# Altium footprint library ICs And Semiconductors SMD.PcbLib: 602 footprints (part 7 of 38)
Each footprint in its own frame and in the unit in brackets; x right, y up, seen from the top. Pads: shape width x height; smd on the part's side, far side on the other; paste and mask are expansions set on the pad; w line width, h text height; cw(c..) or ccw(c..) is an arc to the next point about the centre after c.
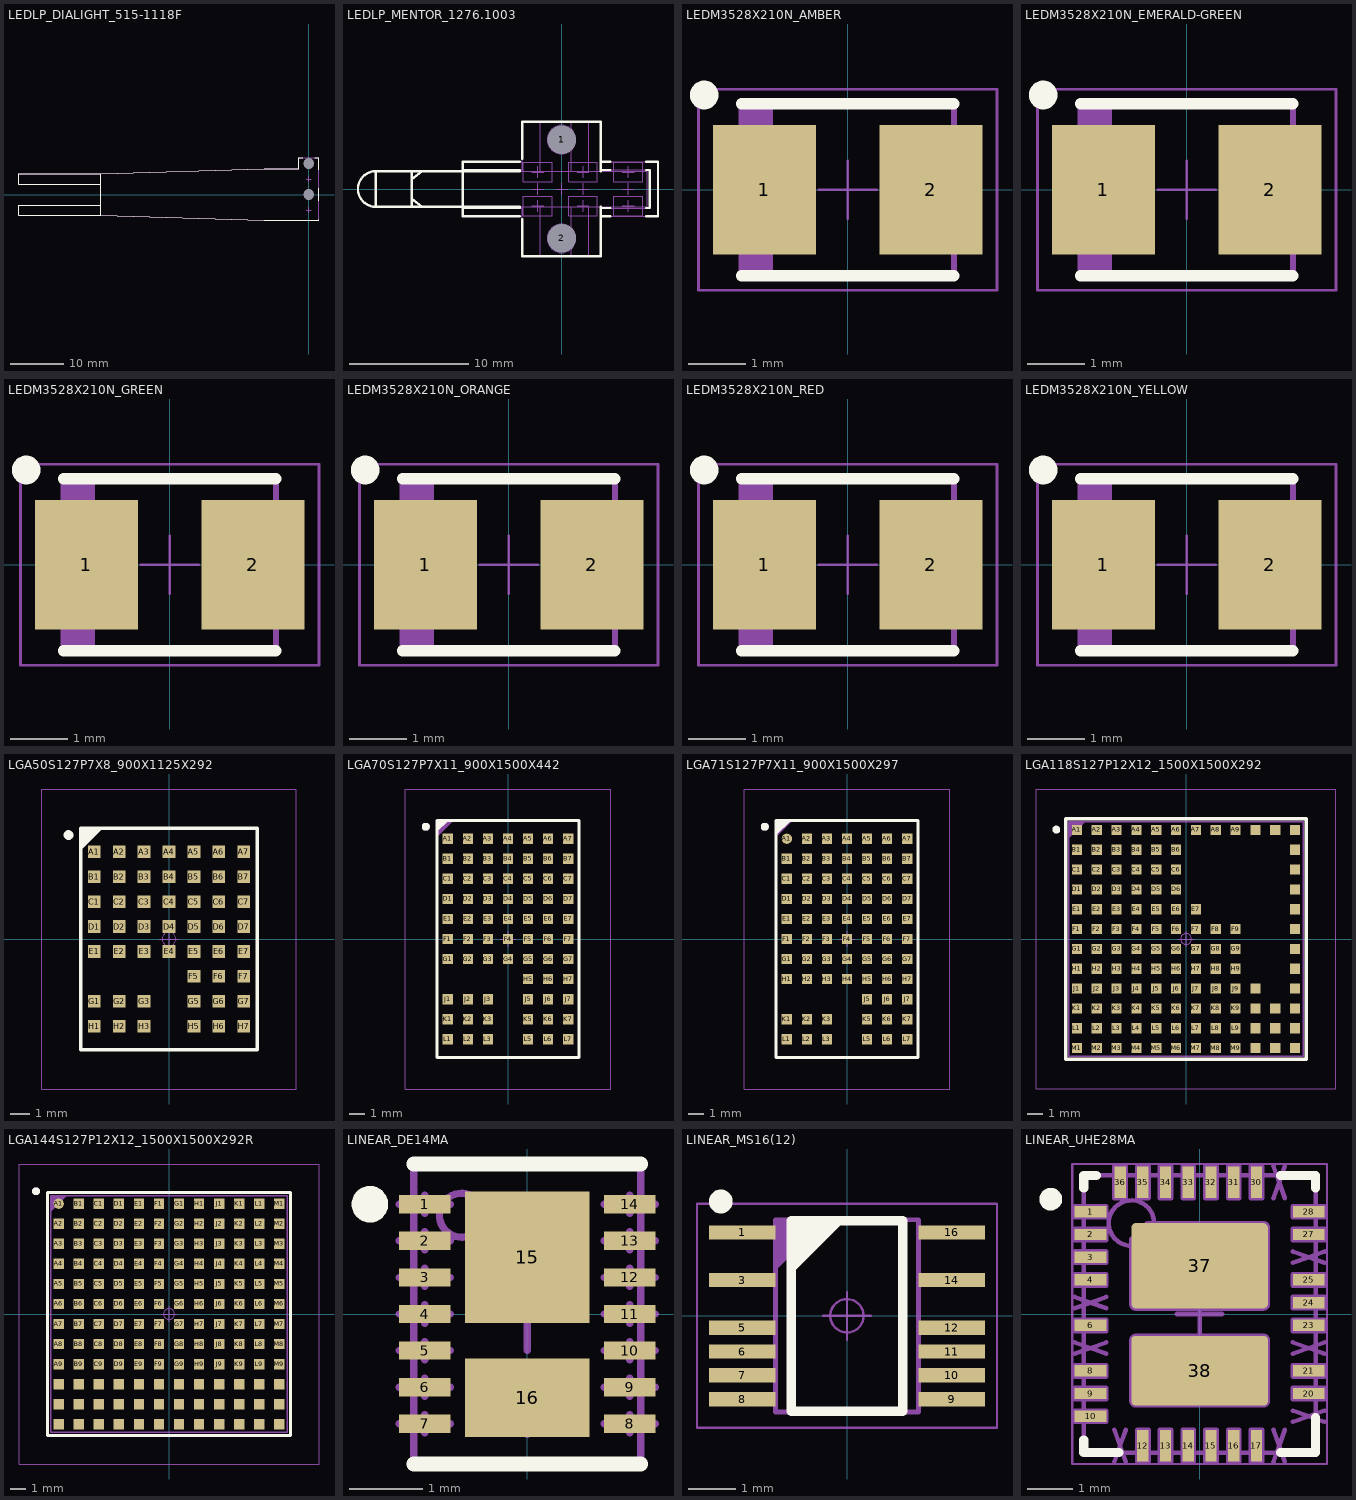
[diagram p6: the footprints below, top view; thin cyan lines are the x and y axes]

## LEDLP_DIALIGHT_515-1118F [mm] "2 Array 1.9mm Round Horizontal Light Pipe, Body 55.8 x11.68mm"
height 14
pads (2):
  round 1 hole 2 unplated mask+0.5: 1(0,0) 2(0,5.791)
Top Overlay:
  lines w0.2: -38.735,-1.943 -53.975,-1.943 -53.975,-3.848 -38.735,-3.848 ; -38.735,1.943 -53.975,1.943 -53.975,3.848 -38.735,3.848 ; -1.1,6.883 -1.905,6.883 -1.905,4.801 -8.255,4.801 -38.735,3.848 ; 1.1,6.883 1.905,6.883 1.905,4.642 ; 1.905,-4.642 1.905,-4.801 -8.255,-4.801 -38.735,-3.848 ; 1.905,-1.149 1.905,1.149 ; -38.735,-3.848 -38.735,3.848
Mechanical 8:
  lines w0.1: -0.5,-2.896 0,-2.896 ; -0.5,0 0,0 ; -0.5,2.896 0,2.896 ; -0.5,5.791 0,5.791 ; 0,-3.396 0,-2.896 ; 0,-2.396 0,-2.896 ; 0,-0.5 0,0 ; 0,0.5 0,0 ; 0,2.396 0,2.896 ; 0,3.396 0,2.896 ; 0,5.291 0,5.791 ; 0,6.291 0,5.791 ; 0.5,-2.896 0,-2.896 ; 0.5,0 0,0 ; 0.5,2.896 0,2.896 ; 0.5,5.791 0,5.791
Mechanical 14:
  lines w0.1: -38.735,-1.943 -53.975,-1.943 -53.975,-3.848 -38.735,-3.848 ; -38.735,1.943 -53.975,1.943 -53.975,3.848 -38.735,3.848 ; -38.735,-3.848 -38.735,3.848 ; -38.735,-3.848 -8.255,-4.801 1.905,-4.801 1.905,6.883 -1.905,6.883 -1.905,4.801 -8.255,4.801 -38.735,3.848
3D body "LEDLP_DIALIGHT_515-1118F.stp": height 13.98, standoff -3.17, extent -53.975,-4.8 1.905,6.884

## LEDLP_MENTOR_1276.1003 [mm] "Right Angle Tri-Level 3mm Round Light Pipe, Body 25.2 x 11.3mm"
height 18.2
pads (2):
  round 1 hole 2.4 unplated mask+0.8: 1(0,4.15) 2(0,-4.15)
Top Overlay:
  lines w0.2: -12.6,-1.5 -12.6,1.5 ; -12.6,-0.794 -11.7,-1.5 ; -12.6,0.794 -11.7,1.5 ; -8.3,-1.6 -3.5,-1.6 ; -8.3,1.6 -3.5,1.6 ; -3.5,-2.3 -8.3,-2.3 -8.3,2.3 -3.5,2.3 ; -3.5,-1.5 -15.6,-1.5 ; -3.5,1.5 -15.6,1.5 ; -3.3,-2.55 -3.3,-5.65 3.3,-5.65 3.3,-2.3 ; -3.3,2.55 -3.3,5.65 3.3,5.65 3.3,2.3 ; 3.3,-1.5 3.3,-2.3 ; 3.3,1.5 3.3,2.3 ; 3.3,1.6 4.1,1.6 ; 3.317,-1.6 4.1,-1.6 ; 4.1,-2.3 3.3,-2.3 ; 4.1,2.3 3.3,2.3 ; 7.1,-2.3 8.1,-2.3 8.1,2.3 7.1,2.3 ; 7.1,-1.6 7.4,-1.6 7.4,1.6 7.1,1.6 ; -15.6,-1.5 cw(c-15.6,0) -15.6,1.5 ; -15.6,-1.5 -15.6,1.5
Mechanical 8:
  circle w0.1: c0,-4.15 r1.2
  circle w0.1: c0,4.15 r1.2
  lines w0.1: -2.5,-1.425 -2,-1.425 ; -2.5,0 -2,0 ; -2.5,1.425 -2,1.425 ; -2,-1.925 -2,-1.425 ; -2,-0.925 -2,-1.425 ; -2,-0.5 -2,0 ; -2,0.5 -2,0 ; -2,0.925 -2,1.425 ; -2,1.925 -2,1.425 ; -1.5,-1.425 -2,-1.425 ; -1.5,0 -2,0 ; -1.5,1.425 -2,1.425 ; -0.5,-4.15 0,-4.15 ; -0.5,0 0,0 ; -0.5,4.15 0,4.15 ; 0,-4.65 0,-4.15 ; 0,-3.65 0,-4.15 ; 0,-0.5 0,0 ; 0,0.5 0,0 ; 0,3.65 0,4.15 ; 0,4.65 0,4.15 ; 0.5,-4.15 0,-4.15 ; 0.5,0 0,0 ; 0.5,4.15 0,4.15 ; 1.3,-1.425 1.8,-1.425 ; 1.3,0 1.8,0 ; 1.3,1.425 1.8,1.425 ; 1.8,-1.925 1.8,-1.425 ; 1.8,-0.925 1.8,-1.425 ; 1.8,-0.5 1.8,0 ; 1.8,0.5 1.8,0 ; 1.8,0.925 1.8,1.425 ; 1.8,1.925 1.8,1.425 ; 2.3,-1.425 1.8,-1.425 ; 2.3,0 1.8,0 ; 2.3,1.425 1.8,1.425 ; 5.1,-1.425 5.6,-1.425 ; 5.1,0 5.6,0 ; 5.1,1.425 5.6,1.425 ; 5.6,-1.925 5.6,-1.425 ; 5.6,-0.925 5.6,-1.425 ; 5.6,-0.5 5.6,0 ; 5.6,0.5 5.6,0 ; 5.6,0.925 5.6,1.425 ; 5.6,1.925 5.6,1.425 ; 6.1,-1.425 5.6,-1.425 ; 6.1,0 5.6,0 ; 6.1,1.425 5.6,1.425 ; -3.2,-2.25 -0.8,-2.25 -0.8,-0.6 -3.2,-0.6 -3.2,-2.25 ; -3.2,0.6 -0.8,0.6 -0.8,2.25 -3.2,2.25 -3.2,0.6 ; 0.6,-2.25 3,-2.25 3,-0.6 0.6,-0.6 0.6,-2.25 ; 0.6,0.6 3,0.6 3,2.25 0.6,2.25 0.6,0.6 ; 4.4,-2.25 6.8,-2.25 6.8,-0.6 4.4,-0.6 4.4,-2.25 ; 4.4,0.6 6.8,0.6 6.8,2.25 4.4,2.25 4.4,0.6
Mechanical 14:
  lines w0.1: -12.6,-1.5 -12.6,1.5 ; -12.6,-0.794 -11.7,-1.5 ; -12.6,0.794 -11.7,1.5 ; -8.3,-1.6 -3.3,-1.6 ; -8.3,1.6 -3.3,1.6 ; -3.3,-1.5 -3.3,-2.3 ; -3.3,1.5 -3.3,5.65 3.3,5.65 3.3,2.3 ; -3.3,2.3 -8.3,2.3 -8.3,-2.3 -3.3,-2.3 ; -1.8,-5.65 -1.8,-1.5 ; -1.8,1.5 -1.8,5.65 ; 0.8,-5.65 0.8,-1.5 ; 0.8,1.5 0.8,5.65 ; 2.3,-5.65 2.3,-1.5 ; 2.3,1.5 2.3,5.65 ; 3.3,-1.5 3.3,-2.3 ; 3.3,1.5 3.3,2.3 ; 3.3,1.6 7.4,1.6 7.4,-1.6 3.317,-1.6 ; -15.6,-1.5 cw(c-15.6,0) -15.6,1.5 ; -15.6,-1.5 -15.6,1.5 ; -15.6,-1.5 7.193,-1.5 7.193,1.5 -15.6,1.5 ; -3.3,-2.3 -3.3,-5.65 3.3,-5.65 3.3,-2.3 ; 3.3,-2.3 8.1,-2.3 8.1,2.3 3.3,2.3
3D body "LEDLP_MENTOR_1276.1003.stp": height 18.2, standoff -2.9, extent -17.1,-5.65 8.1,5.65

## LEDM3528X210N_AMBER [mm] "Molded SMD AMBER LED, 2-Leads, Body 3.5x2.8mm, IPC Medium Density"
height 2.1
pads (2):
  rect 1.8x2.25 smd: 1(-1.45,0) 2(1.45,0)
Top Overlay:
  circle w0.25: c-2.5,1.65 r0.125
  lines w0.2: -1.85,-1.5 1.85,-1.5 ; -1.85,1.5 1.85,1.5
Mechanical 14:
  lines w0.1: -1.8,-1.5 -1.8,1.5 ; -1.725,-1.5 -1.725,1.5 ; -1.65,-1.5 -1.65,1.5 ; -1.575,-1.5 -1.575,1.5 ; -1.5,-1.5 -1.5,1.5 ; -1.425,-1.5 -1.425,1.5 ; -1.35,-1.5 -1.35,1.5 ; -1.85,-1.5 1.85,-1.5 1.85,1.5 -1.85,1.5 -1.85,-1.5
Mechanical 15:
  lines w0.05: -0.5,0 0.5,0 ; 0,-0.5 0,0.5 ; -2.6,-1.75 2.6,-1.75 2.6,1.75 -2.6,1.75 -2.6,-1.75
3D body "LEDM3528X210N_AMBER.stp": height 2.1, standoff 0, extent -1.85,-1.5 1.85,1.5

## LEDM3528X210N_EMERALD-GREEN [mm] "Molded SMD Emerald Green LED, 2-Leads, Body 3.5x2.8mm, IPC Medium Density"
height 2.1
pads (2):
  rect 1.8x2.25 smd: 1(-1.45,0) 2(1.45,0)
Top Overlay:
  circle w0.25: c-2.5,1.65 r0.125
  lines w0.2: -1.85,-1.5 1.85,-1.5 ; -1.85,1.5 1.85,1.5
Mechanical 14:
  lines w0.1: -1.8,-1.5 -1.8,1.5 ; -1.725,-1.5 -1.725,1.5 ; -1.65,-1.5 -1.65,1.5 ; -1.575,-1.5 -1.575,1.5 ; -1.5,-1.5 -1.5,1.5 ; -1.425,-1.5 -1.425,1.5 ; -1.35,-1.5 -1.35,1.5 ; -1.85,-1.5 -1.85,1.5 1.85,1.5 1.85,-1.5 -1.85,-1.5
Mechanical 15:
  lines w0.05: -0.5,0 0.5,0 ; 0,-0.5 0,0.5 ; -2.6,-1.75 -2.6,1.75 2.6,1.75 2.6,-1.75 -2.6,-1.75
3D body "LEDM3528X210N_EMERALD-GREEN.stp": height 2.1, standoff 0, extent -1.85,-1.5 1.85,1.5

## LEDM3528X210N_GREEN [mm] "Molded SMD Green LED, 2-Leads, Body 3.5x2.8mm, IPC Medium Density"
height 2.1
pads (2):
  rect 1.8x2.25 smd: 1(-1.45,0) 2(1.45,0)
Top Overlay:
  circle w0.25: c-2.5,1.65 r0.125
  lines w0.2: -1.85,-1.5 1.85,-1.5 ; -1.85,1.5 1.85,1.5
Mechanical 14:
  lines w0.1: -1.8,-1.5 -1.8,1.5 ; -1.725,-1.5 -1.725,1.5 ; -1.65,-1.5 -1.65,1.5 ; -1.575,-1.5 -1.575,1.5 ; -1.5,-1.5 -1.5,1.5 ; -1.425,-1.5 -1.425,1.5 ; -1.35,-1.5 -1.35,1.5 ; -1.85,-1.5 -1.85,1.5 1.85,1.5 1.85,-1.5 -1.85,-1.5
Mechanical 15:
  lines w0.05: -0.5,0 0.5,0 ; 0,-0.5 0,0.5 ; -2.6,-1.75 -2.6,1.75 2.6,1.75 2.6,-1.75 -2.6,-1.75
3D body "LEDM3528X210N_GREEN.stp": height 2.1, standoff 0, extent -1.85,-1.5 1.85,1.5

## LEDM3528X210N_ORANGE [mm] "Molded SMD ORANGE LED, 2-Leads, Body 3.5x2.8mm, IPC Medium Density"
height 2.1
pads (2):
  rect 1.8x2.25 smd: 1(-1.45,0) 2(1.45,0)
Top Overlay:
  circle w0.25: c-2.5,1.65 r0.125
  lines w0.2: -1.85,-1.5 1.85,-1.5 ; -1.85,1.5 1.85,1.5
Mechanical 14:
  lines w0.1: -1.8,-1.5 -1.8,1.5 ; -1.725,-1.5 -1.725,1.5 ; -1.65,-1.5 -1.65,1.5 ; -1.575,-1.5 -1.575,1.5 ; -1.5,-1.5 -1.5,1.5 ; -1.425,-1.5 -1.425,1.5 ; -1.35,-1.5 -1.35,1.5 ; -1.85,-1.5 1.85,-1.5 1.85,1.5 -1.85,1.5 -1.85,-1.5
Mechanical 15:
  lines w0.05: -0.5,0 0.5,0 ; 0,-0.5 0,0.5 ; -2.6,-1.75 2.6,-1.75 2.6,1.75 -2.6,1.75 -2.6,-1.75
3D body "LEDM3528X210N_ORANGE.stp": height 2.1, standoff 0, extent -1.85,-1.5 1.85,1.5

## LEDM3528X210N_RED [mm] "Molded SMD RED LED, 2-Leads, Body 3.5x2.8mm, IPC Medium Density"
height 2.1
pads (2):
  rect 1.8x2.25 smd: 1(-1.45,0) 2(1.45,0)
Top Overlay:
  circle w0.25: c-2.5,1.65 r0.125
  lines w0.2: -1.85,-1.5 1.85,-1.5 ; -1.85,1.5 1.85,1.5
Mechanical 14:
  lines w0.1: -1.8,-1.5 -1.8,1.5 ; -1.725,-1.5 -1.725,1.5 ; -1.65,-1.5 -1.65,1.5 ; -1.575,-1.5 -1.575,1.5 ; -1.5,-1.5 -1.5,1.5 ; -1.425,-1.5 -1.425,1.5 ; -1.35,-1.5 -1.35,1.5 ; -1.85,-1.5 -1.85,1.5 1.85,1.5 1.85,-1.5 -1.85,-1.5
Mechanical 15:
  lines w0.05: -0.5,0 0.5,0 ; 0,-0.5 0,0.5 ; -2.6,-1.75 -2.6,1.75 2.6,1.75 2.6,-1.75 -2.6,-1.75
3D body "LEDM3528X210N_RED.stp": height 2.1, standoff 0, extent -1.85,-1.5 1.85,1.5

## LEDM3528X210N_YELLOW [mm] "Molded SMD YELLOW LED, 2-Leads, Body 3.5x2.8mm, IPC Medium Density"
height 2.1
pads (2):
  rect 1.8x2.25 smd: 1(-1.45,0) 2(1.45,0)
Top Overlay:
  circle w0.25: c-2.5,1.65 r0.125
  lines w0.2: -1.85,-1.5 1.85,-1.5 ; -1.85,1.5 1.85,1.5
Mechanical 14:
  lines w0.1: -1.8,-1.5 -1.8,1.5 ; -1.725,-1.5 -1.725,1.5 ; -1.65,-1.5 -1.65,1.5 ; -1.575,-1.5 -1.575,1.5 ; -1.5,-1.5 -1.5,1.5 ; -1.425,-1.5 -1.425,1.5 ; -1.35,-1.5 -1.35,1.5 ; -1.85,-1.5 1.85,-1.5 1.85,1.5 -1.85,1.5 -1.85,-1.5
Mechanical 15:
  lines w0.05: -0.5,0 0.5,0 ; 0,-0.5 0,0.5 ; -2.6,-1.75 2.6,-1.75 2.6,1.75 -2.6,1.75 -2.6,-1.75
3D body "LEDM3528X210N_YELLOW.stp": height 2.1, standoff 0, extent -1.85,-1.5 1.85,1.5

## LGA50S127P7X8_900X1125X292 [mm] "LGA, 1.27mm pitch,rect.; 50 pin,7 columns X 8 rows, 9.00mm X 11.25mm X 2.92mm H"
height 2.92
pads (50):
  rect 0.65x0.65 smd: A1(-3.81,4.445) A2(-2.54,4.445) A3(-1.27,4.445) A4(0,4.445) A5(1.27,4.445) A6(2.54,4.445) A7(3.81,4.445) B1(-3.81,3.175) B2(-2.54,3.175) B3(-1.27,3.175) B4(0,3.175) B5(1.27,3.175) B6(2.54,3.175) B7(3.81,3.175) C1(-3.81,1.905) C2(-2.54,1.905) C3(-1.27,1.905) C4(0,1.905) C5(1.27,1.905) C6(2.54,1.905) C7(3.81,1.905) D1(-3.81,0.635) D2(-2.54,0.635) D3(-1.27,0.635) D4(0,0.635) D5(1.27,0.635) D6(2.54,0.635) D7(3.81,0.635) E1(-3.81,-0.635) E2(-2.54,-0.635) E3(-1.27,-0.635) E4(0,-0.635) E5(1.27,-0.635) E6(2.54,-0.635) E7(3.81,-0.635) F5(1.27,-1.905) F6(2.54,-1.905) F7(3.81,-1.905) G1(-3.81,-3.175) G2(-2.54,-3.175) G3(-1.27,-3.175) G5(1.27,-3.175) G6(2.54,-3.175) G7(3.81,-3.175) H1(-3.81,-4.445) H2(-2.54,-4.445) H3(-1.27,-4.445) H5(1.27,-4.445) H6(2.54,-4.445) H7(3.81,-4.445)
Top Overlay:
  circle w0.25: c-5.125,5.3 r0.125
  lines w0.2: -4.5,4.65 -3.5,5.65 ; -4.5,4.85 -3.7,5.65 ; -4.5,5.05 -3.9,5.65 ; -4.5,5.25 -4.1,5.65 ; -4.5,5.45 -4.3,5.65 ; -4.5,-5.65 -4.5,5.65 4.5,5.65 4.5,-5.65 -4.5,-5.65
Mechanical 14:
  lines w0.1: -4.5,4.65 -3.5,5.65 ; -4.5,4.75 -3.6,5.65 ; -4.5,4.85 -3.7,5.65 ; -4.5,4.95 -3.8,5.65 ; -4.5,5.05 -3.9,5.65 ; -4.5,5.15 -4,5.65 ; -4.5,5.25 -4.1,5.65 ; -4.5,5.35 -4.2,5.65 ; -4.5,5.45 -4.3,5.65 ; -4.5,5.55 -4.4,5.65 ; -4.5,-5.625 -4.5,5.625 4.5,5.625 4.5,-5.625 -4.5,-5.625
  text "6" at 2.477,5.988 h0.4
  text "5" at 1.207,5.988 h0.4
  text "4" at -0.063,5.988 h0.4
  text "7" at 3.747,5.988 h0.4
  text "3" at -1.333,5.988 h0.4
  text "2" at -2.603,5.988 h0.4
  text "1" at -3.873,5.988 h0.4
  text "A" at -5.016,4.337 h0.4
  text "B" at -5.016,3.067 h0.4
  text "C" at -5.016,1.797 h0.4
  text "D" at -5.016,0.527 h0.4
  text "E" at -5.016,-0.743 h0.4
  text "F" at -5.016,-2.013 h0.4
  text "G" at -5.016,-3.283 h0.4
  text "H" at -5.016,-4.553 h0.4
Mechanical 15:
  circle w0.05: c0,0 r0.35
  lines w0.05: -0.5,0 0.5,0 ; 0,-0.5 0,0.5 ; -6.5,-7.65 -6.5,7.65 6.5,7.65 6.5,-7.65 -6.5,-7.65
3D body "LGA50S127P7X8_900X1125X292.stp": height 2.92, standoff 0, extent -4.5,-5.625 4.5,5.625

## LGA70S127P7X11_900X1500X442 [mm] "LGA, 1.27mm pitch, rect., 70 pin, 7 columns X 11 rows, 9mm X 15mm X 4.42mm H"
height 4.42
pads (70):
  rect 0.65x0.65 smd: A1(-3.81,6.35) A2(-2.54,6.35) A3(-1.27,6.35) A4(0,6.35) A5(1.27,6.35) A6(2.54,6.35) A7(3.81,6.35) B1(-3.81,5.08) B2(-2.54,5.08) B3(-1.27,5.08) B4(0,5.08) B5(1.27,5.08) B6(2.54,5.08) B7(3.81,5.08) C1(-3.81,3.81) C2(-2.54,3.81) C3(-1.27,3.81) C4(0,3.81) C5(1.27,3.81) C6(2.54,3.81) C7(3.81,3.81) D1(-3.81,2.54) D2(-2.54,2.54) D3(-1.27,2.54) D4(0,2.54) D5(1.27,2.54) D6(2.54,2.54) D7(3.81,2.54) E1(-3.81,1.27) E2(-2.54,1.27) E3(-1.27,1.27) E4(0,1.27) E5(1.27,1.27) E6(2.54,1.27) E7(3.81,1.27) F1(-3.81,0) F2(-2.54,0) F3(-1.27,0) F4(0,0) F5(1.27,0) F6(2.54,0) F7(3.81,0) G1(-3.81,-1.27) G2(-2.54,-1.27) G3(-1.27,-1.27) G4(0,-1.27) G5(1.27,-1.27) G6(2.54,-1.27) G7(3.81,-1.27) H5(1.27,-2.54) H6(2.54,-2.54) H7(3.81,-2.54) J1(-3.81,-3.81) J2(-2.54,-3.81) J3(-1.27,-3.81) J5(1.27,-3.81) J6(2.54,-3.81) J7(3.81,-3.81) K1(-3.81,-5.08) K2(-2.54,-5.08) K3(-1.27,-5.08) K5(1.27,-5.08) K6(2.54,-5.08) K7(3.81,-5.08) L1(-3.81,-6.35) L2(-2.54,-6.35) L3(-1.27,-6.35) L5(1.27,-6.35) L6(2.54,-6.35) L7(3.81,-6.35)
Top Overlay:
  circle w0.25: c-5.205,7.112 r0.125
  lines w0.2: -4.5,6.9 -3.9,7.5 ; -4.5,7.1 -4.1,7.5 ; -4.5,7.3 -4.3,7.5 ; -4.5,-7.5 4.5,-7.5 4.5,7.5 -4.5,7.5 -4.5,-7.5
Mechanical 14:
  circle w0.25: c-5.205,7.112 r0.125
  lines w0.1: -4.5,6.5 -3.5,7.5 ; -4.5,6.6 -3.6,7.5 ; -4.5,6.7 -3.7,7.5 ; -4.5,6.8 -3.8,7.5 ; -4.5,6.9 -3.9,7.5 ; -4.5,7 -4,7.5 ; -4.5,7.1 -4.1,7.5 ; -4.5,7.2 -4.2,7.5 ; -4.5,7.3 -4.3,7.5 ; -4.5,7.4 -4.4,7.5 ; -4.5,-7.5 -4.5,7.5 4.5,7.5 4.5,-7.5 -4.5,-7.5
  text "6" at 2.413,7.874 h0.4
  text "5" at 1.143,7.874 h0.4
  text "4" at -0.127,7.874 h0.4
  text "7" at 3.683,7.874 h0.4
  text "3" at -1.397,7.874 h0.4
  text "2" at -2.667,7.874 h0.4
  text "1" at -3.937,7.874 h0.4
  text "J" at -5.08,-3.937 h0.4
  text "A" at -5.08,6.223 h0.4
  text "B" at -5.08,4.953 h0.4
  text "C" at -5.08,3.683 h0.4
  text "D" at -5.08,2.413 h0.4
  text "E" at -5.08,1.143 h0.4
  text "F" at -5.08,-0.127 h0.4
  text "G" at -5.08,-1.397 h0.4
  text "H" at -5.08,-2.667 h0.4
  text "K" at -5.08,-5.207 h0.4
  text "L" at -5.08,-6.477 h0.4
Mechanical 15:
  lines w0.05: -0.5,0 0.5,0 ; 0,-0.5 0,0.5 ; -6.5,-9.5 -6.5,9.5 6.5,9.5 6.5,-9.5 -6.5,-9.5
3D body "LGA70S127P7X11_900X1500X442.stp": height 4.42, standoff 0, extent -4.5,-7.5 4.5,7.5

## LGA71S127P7X11_900X1500X297 [mm] "LGA, 1.27mm pitch, rect., 71 pin, 7 columns X 11 rows, 9mm X 15mm X 2.97mm H"
height 2.97
pads (71):
  round 0.65 smd: A1(-3.81,6.35)
  rect 0.65x0.65 smd: A2(-2.54,6.35) A3(-1.27,6.35) A4(0,6.35) A5(1.27,6.35) A6(2.54,6.35) A7(3.81,6.35) B1(-3.81,5.08) B2(-2.54,5.08) B3(-1.27,5.08) B4(0,5.08) B5(1.27,5.08) B6(2.54,5.08) B7(3.81,5.08) C1(-3.81,3.81) C2(-2.54,3.81) C3(-1.27,3.81) C4(0,3.81) C5(1.27,3.81) C6(2.54,3.81) C7(3.81,3.81) D1(-3.81,2.54) D2(-2.54,2.54) D3(-1.27,2.54) D4(0,2.54) D5(1.27,2.54) D6(2.54,2.54) D7(3.81,2.54) E1(-3.81,1.27) E2(-2.54,1.27) E3(-1.27,1.27) E4(0,1.27) E5(1.27,1.27) E6(2.54,1.27) E7(3.81,1.27) F1(-3.81,0) F2(-2.54,0) F3(-1.27,0) F4(0,0) F5(1.27,0) F6(2.54,0) F7(3.81,0) G1(-3.81,-1.27) G2(-2.54,-1.27) G3(-1.27,-1.27) G4(0,-1.27) G5(1.27,-1.27) G6(2.54,-1.27) G7(3.81,-1.27) H1(-3.81,-2.54) H2(-2.54,-2.54) H3(-1.27,-2.54) H4(0,-2.54) H5(1.27,-2.54) H6(2.54,-2.54) H7(3.81,-2.54) J5(1.27,-3.81) J6(2.54,-3.81) J7(3.81,-3.81) K1(-3.81,-5.08) K2(-2.54,-5.08) K3(-1.27,-5.08) K5(1.27,-5.08) K6(2.54,-5.08) K7(3.81,-5.08) L1(-3.81,-6.35) L2(-2.54,-6.35) L3(-1.27,-6.35) L5(1.27,-6.35) L6(2.54,-6.35) L7(3.81,-6.35)
Top Overlay:
  circle w0.25: c-5.205,7.112 r0.125
  lines w0.2: -4.5,6.7 -3.7,7.5 ; -4.5,6.9 -3.9,7.5 ; -4.5,7.1 -4.1,7.5 ; -4.5,7.3 -4.3,7.5 ; -4.5,-7.5 4.5,-7.5 4.5,7.5 -4.5,7.5 -4.5,-7.5
Mechanical 14:
  circle w0.25: c-5.205,7.112 r0.125
  lines w0.1: -4.5,6.5 -3.5,7.5 ; -4.5,6.6 -3.6,7.5 ; -4.5,6.7 -3.7,7.5 ; -4.5,6.8 -3.8,7.5 ; -4.5,6.9 -3.9,7.5 ; -4.5,7 -4,7.5 ; -4.5,7.1 -4.1,7.5 ; -4.5,7.2 -4.2,7.5 ; -4.5,7.3 -4.3,7.5 ; -4.5,7.4 -4.4,7.5 ; -4.5,-7.5 -4.5,7.5 4.5,7.5 4.5,-7.5 -4.5,-7.5
  text "6" at 2.413,7.874 h0.4
  text "5" at 1.143,7.874 h0.4
  text "4" at -0.127,7.874 h0.4
  text "7" at 3.683,7.874 h0.4
  text "3" at -1.397,7.874 h0.4
  text "2" at -2.667,7.874 h0.4
  text "1" at -3.937,7.874 h0.4
  text "J" at -5.08,-3.937 h0.4
  text "A" at -5.08,6.223 h0.4
  text "B" at -5.08,4.953 h0.4
  text "C" at -5.08,3.683 h0.4
  text "D" at -5.08,2.413 h0.4
  text "E" at -5.08,1.143 h0.4
  text "F" at -5.08,-0.127 h0.4
  text "G" at -5.08,-1.397 h0.4
  text "H" at -5.08,-2.667 h0.4
  text "K" at -5.08,-5.207 h0.4
  text "L" at -5.08,-6.477 h0.4
Mechanical 15:
  lines w0.05: -0.5,0 0.5,0 ; 0,-0.5 0,0.5 ; -6.5,-9.5 -6.5,9.5 6.5,9.5 6.5,-9.5 -6.5,-9.5
3D body "LGA71S127P7X11_900X1500X297.stp": height 2.97, standoff 0, extent -4.5,-7.5 4.5,7.5

## LGA118S127P12X12_1500X1500X292 [mm] "LGA,1.27mm Pitch,Square;118 Pin,12 Columns X 12 Rows,15.00mm X 15.00mm X 2.92mm H"
height 2.92
pads (118):
  rect 0.65x0.65 smd: A1(-6.985,6.985) A2(-5.715,6.985) A3(-4.445,6.985) A4(-3.175,6.985) A5(-1.905,6.985) A6(-0.635,6.985) A7(0.635,6.985) A8(1.905,6.985) A9(3.175,6.985) A10(4.445,6.985) A11(5.715,6.985) A12(6.985,6.985) B1(-6.985,5.715) B2(-5.715,5.715) B3(-4.445,5.715) B4(-3.175,5.715) B5(-1.905,5.715) B6(-0.635,5.715) B12(6.985,5.715) C1(-6.985,4.445) C2(-5.715,4.445) C3(-4.445,4.445) C4(-3.175,4.445) C5(-1.905,4.445) C6(-0.635,4.445) C12(6.985,4.445) D1(-6.985,3.175) D2(-5.715,3.175) D3(-4.445,3.175) D4(-3.175,3.175) D5(-1.905,3.175) D6(-0.635,3.175) D12(6.985,3.175) E1(-6.985,1.905) E2(-5.715,1.905) E3(-4.445,1.905) E4(-3.175,1.905) E5(-1.905,1.905) E6(-0.635,1.905) E7(0.635,1.905) E12(6.985,1.905) F1(-6.985,0.635) F2(-5.715,0.635) F3(-4.445,0.635) F4(-3.175,0.635) F5(-1.905,0.635) F6(-0.635,0.635) F7(0.635,0.635) F8(1.905,0.635) F9(3.175,0.635) F12(6.985,0.635) G1(-6.985,-0.635) G2(-5.715,-0.635) G3(-4.445,-0.635) G4(-3.175,-0.635) G5(-1.905,-0.635) G6(-0.635,-0.635) G7(0.635,-0.635) G8(1.905,-0.635) G9(3.175,-0.635) G12(6.985,-0.635) H1(-6.985,-1.905) H2(-5.715,-1.905) H3(-4.445,-1.905) H4(-3.175,-1.905) H5(-1.905,-1.905) H6(-0.635,-1.905) H7(0.635,-1.905) H8(1.905,-1.905) H9(3.175,-1.905) H12(6.985,-1.905) J1(-6.985,-3.175) J2(-5.715,-3.175) J3(-4.445,-3.175) J4(-3.175,-3.175) J5(-1.905,-3.175) J6(-0.635,-3.175) J7(0.635,-3.175) J8(1.905,-3.175) J9(3.175,-3.175) J10(4.445,-3.175) J12(6.985,-3.175) K1(-6.985,-4.445) K2(-5.715,-4.445) K3(-4.445,-4.445) K4(-3.175,-4.445) K5(-1.905,-4.445) K6(-0.635,-4.445) K7(0.635,-4.445) K8(1.905,-4.445) K9(3.175,-4.445) K10(4.445,-4.445) K11(5.715,-4.445) K12(6.985,-4.445) L1(-6.985,-5.715) L2(-5.715,-5.715) L3(-4.445,-5.715) L4(-3.175,-5.715) L5(-1.905,-5.715) L6(-0.635,-5.715) L7(0.635,-5.715) L8(1.905,-5.715) L9(3.175,-5.715) L10(4.445,-5.715) L11(5.715,-5.715) L12(6.985,-5.715) M1(-6.985,-6.985) M2(-5.715,-6.985) M3(-4.445,-6.985) M4(-3.175,-6.985) M5(-1.905,-6.985) M6(-0.635,-6.985) M7(0.635,-6.985) M8(1.905,-6.985) M9(3.175,-6.985) M10(4.445,-6.985) M11(5.715,-6.985) M12(6.985,-6.985)
Top Overlay:
  circle w0.25: c-8.3,7 r0.125
  lines w0.2: -7.7,-7.7 -7.7,7.7 7.7,7.7 7.7,-7.7 -7.7,-7.7
Mechanical 14:
  lines w0.1: -7.5,6.5 -6.5,7.5 ; -7.5,6.6 -6.6,7.5 ; -7.5,6.7 -6.7,7.5 ; -7.5,6.8 -6.8,7.5 ; -7.5,6.9 -6.9,7.5 ; -7.5,7 -7,7.5 ; -7.5,7.1 -7.1,7.5 ; -7.5,7.2 -7.2,7.5 ; -7.5,7.3 -7.3,7.5 ; -7.5,7.4 -7.4,7.5 ; -7.5,-7.5 -7.5,7.5 7.5,7.5 7.5,-7.5 -7.5,-7.5
  text "L" at -8.055,-7.137 h0.4
  text "K" at -8.055,-5.867 h0.4
  text "J" at -8.055,-4.597 h0.4
  text "I" at -7.926,-3.302 h0.4
  text "H" at -8.001,-2.032 h0.4
  text "A" at -8.001,6.858 h0.4
  text "B" at -8.001,5.588 h0.4
  text "C" at -8.001,4.318 h0.4
  text "G" at -8.001,-0.762 h0.4
  text "D" at -8.001,3.048 h0.4
  text "E" at -8.001,1.778 h0.4
  text "F" at -8.001,0.508 h0.4
  text "12" at 6.858,7.747 h0.4
  text "11" at 5.588,7.747 h0.4
  text "10" at 4.318,7.747 h0.4
  text "8" at 1.778,7.747 h0.4
  text "7" at 0.508,7.747 h0.4
  text "6" at -0.762,7.747 h0.4
  text "5" at -2.032,7.747 h0.4
  text "4" at -3.302,7.747 h0.4
  text "3" at -4.572,7.747 h0.4
  text "2" at -5.842,7.747 h0.4
  text "1" at -7.112,7.747 h0.4
  text "9" at 3.048,7.747 h0.4
Mechanical 15:
  circle w0.05: c0,0 r0.35
  lines w0.05: -0.5,0 0.5,0 ; 0,-0.5 0,0.5 ; -9.6,-9.6 -9.6,9.6 9.6,9.6 9.6,-9.6 -9.6,-9.6
3D body "LGA118S127P12X12_1500X1500X292.stp": height 2.92, standoff 0, extent -7.5,-7.5 7.5,7.5

## LGA144S127P12X12_1500X1500X292R [mm] "LGA,1.27mm pitch,square;144 pin,12 columns X 12 rows,15.00mm X 15.00mm X 2.92mm H (w/reversed pins)"
height 2.97
pads (144):
  round 0.65 smd: A1(-6.985,6.985)
  rect 0.65x0.65 smd: A2(-6.985,5.715) A3(-6.985,4.445) A4(-6.985,3.175) A5(-6.985,1.905) A6(-6.985,0.635) A7(-6.985,-0.635) A8(-6.985,-1.905) A9(-6.985,-3.175) A10(-6.985,-4.445) A11(-6.985,-5.715) A12(-6.985,-6.985) B1(-5.715,6.985) B2(-5.715,5.715) B3(-5.715,4.445) B4(-5.715,3.175) B5(-5.715,1.905) B6(-5.715,0.635) B7(-5.715,-0.635) B8(-5.715,-1.905) B9(-5.715,-3.175) B10(-5.715,-4.445) B11(-5.715,-5.715) B12(-5.715,-6.985) C1(-4.445,6.985) C2(-4.445,5.715) C3(-4.445,4.445) C4(-4.445,3.175) C5(-4.445,1.905) C6(-4.445,0.635) C7(-4.445,-0.635) C8(-4.445,-1.905) C9(-4.445,-3.175) C10(-4.445,-4.445) C11(-4.445,-5.715) C12(-4.445,-6.985) D1(-3.175,6.985) D2(-3.175,5.715) D3(-3.175,4.445) D4(-3.175,3.175) D5(-3.175,1.905) D6(-3.175,0.635) D7(-3.175,-0.635) D8(-3.175,-1.905) D9(-3.175,-3.175) D10(-3.175,-4.445) D11(-3.175,-5.715) D12(-3.175,-6.985) E1(-1.905,6.985) E2(-1.905,5.715) E3(-1.905,4.445) E4(-1.905,3.175) E5(-1.905,1.905) E6(-1.905,0.635) E7(-1.905,-0.635) E8(-1.905,-1.905) E9(-1.905,-3.175) E10(-1.905,-4.445) E11(-1.905,-5.715) E12(-1.905,-6.985) F1(-0.635,6.985) F2(-0.635,5.715) F3(-0.635,4.445) F4(-0.635,3.175) F5(-0.635,1.905) F6(-0.635,0.635) F7(-0.635,-0.635) F8(-0.635,-1.905) F9(-0.635,-3.175) F10(-0.635,-4.445) F11(-0.635,-5.715) F12(-0.635,-6.985) G1(0.635,6.985) G2(0.635,5.715) G3(0.635,4.445) G4(0.635,3.175) G5(0.635,1.905) G6(0.635,0.635) G7(0.635,-0.635) G8(0.635,-1.905) G9(0.635,-3.175) G10(0.635,-4.445) G11(0.635,-5.715) G12(0.635,-6.985) H1(1.905,6.985) H2(1.905,5.715) H3(1.905,4.445) H4(1.905,3.175) H5(1.905,1.905) H6(1.905,0.635) H7(1.905,-0.635) H8(1.905,-1.905) H9(1.905,-3.175) H10(1.905,-4.445) H11(1.905,-5.715) H12(1.905,-6.985) J1(3.175,6.985) J2(3.175,5.715) J3(3.175,4.445) J4(3.175,3.175) J5(3.175,1.905) J6(3.175,0.635) J7(3.175,-0.635) J8(3.175,-1.905) J9(3.175,-3.175) J10(3.175,-4.445) J11(3.175,-5.715) J12(3.175,-6.985) K1(4.445,6.985) K2(4.445,5.715) K3(4.445,4.445) K4(4.445,3.175) K5(4.445,1.905) K6(4.445,0.635) K7(4.445,-0.635) K8(4.445,-1.905) K9(4.445,-3.175) K10(4.445,-4.445) K11(4.445,-5.715) K12(4.445,-6.985) L1(5.715,6.985) L2(5.715,5.715) L3(5.715,4.445) L4(5.715,3.175) L5(5.715,1.905) L6(5.715,0.635) L7(5.715,-0.635) L8(5.715,-1.905) L9(5.715,-3.175) L10(5.715,-4.445) L11(5.715,-5.715) L12(5.715,-6.985) M1(6.985,6.985) M2(6.985,5.715) M3(6.985,4.445) M4(6.985,3.175) M5(6.985,1.905) M6(6.985,0.635) M7(6.985,-0.635) M8(6.985,-1.905) M9(6.985,-3.175) M10(6.985,-4.445) M11(6.985,-5.715) M12(6.985,-6.985)
Top Overlay:
  circle w0.25: c-8.425,7.775 r0.125
  lines w0.2: -7.7,-7.7 7.7,-7.7 7.7,7.7 -7.7,7.7 -7.7,-7.7
Mechanical 14:
  circle w0.25: c-8.425,7.775 r0.125
  lines w0.1: -7.5,6.5 -6.5,7.5 ; -7.5,6.6 -6.6,7.5 ; -7.5,6.7 -6.7,7.5 ; -7.5,6.8 -6.8,7.5 ; -7.5,6.9 -6.9,7.5 ; -7.5,7 -7,7.5 ; -7.5,7.1 -7.1,7.5 ; -7.5,7.2 -7.2,7.5 ; -7.5,7.3 -7.3,7.5 ; -7.5,7.4 -7.4,7.5 ; -7.5,-7.5 7.5,-7.5 7.5,7.5 -7.5,7.5 -7.5,-7.5
  text "6" at -8.001,0.508 h0.4
  text "5" at -8.001,1.778 h0.4
  text "4" at -8.001,3.048 h0.4
  text "7" at -8.001,-0.762 h0.4
  text "3" at -8.001,4.318 h0.4
  text "2" at -8.001,5.588 h0.4
  text "1" at -8.001,6.858 h0.4
  text "J" at 3.048,7.747 h0.4
  text "A" at -7.112,7.747 h0.4
  text "B" at -5.842,7.747 h0.4
  text "C" at -4.572,7.747 h0.4
  text "D" at -3.302,7.747 h0.4
  text "E" at -2.032,7.747 h0.4
  text "F" at -0.762,7.747 h0.4
  text "G" at 0.508,7.747 h0.4
  text "H" at 1.778,7.747 h0.4
  text "K" at 4.318,7.747 h0.4
  text "L" at 5.588,7.747 h0.4
  text "M" at 6.858,7.747 h0.4
  text "8" at -8.001,-2.032 h0.4
  text "9" at -8.001,-3.302 h0.4
  text "10" at -8.255,-4.572 h0.4
  text "11" at -8.255,-5.842 h0.4
  text "12" at -8.255,-7.112 h0.4
Mechanical 15:
  circle w0.05: c0,0 r0.35
  lines w0.05: -0.5,0 0.5,0 ; 0,-0.5 0,0.5 ; -9.5,-9.5 9.5,-9.5 9.5,9.5 -9.5,9.5 -9.5,-9.5
3D body "LGA144S127P12X12_1500X1500X292R.stp": height 2.92, standoff 0, extent -7.5,-7.5 7.5,7.5

## LINEAR_DE14MA [mm] "DFN, 14-Leads, Body 3x4mm, Pitch 0.50mm, LINEAR DE14MA Package"
height 0.8
pads (16):
  rect 0.7x0.25 smd: 1(-1.4,1.5) 2(-1.4,1) 3(-1.4,0.5) 4(-1.4,0) 5(-1.4,-0.5) 6(-1.4,-1) 7(-1.4,-1.5) 8(1.4,-1.5) 9(1.4,-1) 10(1.4,-0.5) 11(1.4,0) 12(1.4,0.5) 13(1.4,1) 14(1.4,1.5)
  rect 1.7x1.8 smd: 15(0,0.778)
  rect 1.7x1.07 smd: 16(0,-1.145)
Top Overlay:
  circle w0.25: c-2.15,1.5 r0.125
  lines w0.2: -1.55,-2.05 1.55,-2.05 ; -1.55,2.05 1.55,2.05
Mechanical 8:
  lines w0.1: -1.75,-1.5 -1.4,-1.5 ; -1.75,-1 -1.4,-1 ; -1.75,-0.5 -1.4,-0.5 ; -1.75,0 -1.4,0 ; -1.75,0.5 -1.4,0.5 ; -1.75,1 -1.4,1 ; -1.75,1.5 -1.4,1.5 ; -1.4,-1.625 -1.4,-1.5 ; -1.4,-1.375 -1.4,-1.5 ; -1.4,-1.125 -1.4,-1 ; -1.4,-0.875 -1.4,-1 ; -1.4,-0.625 -1.4,-0.5 ; -1.4,-0.375 -1.4,-0.5 ; -1.4,-0.125 -1.4,0 ; -1.4,0.125 -1.4,0 ; -1.4,0.375 -1.4,0.5 ; -1.4,0.625 -1.4,0.5 ; -1.4,0.875 -1.4,1 ; -1.4,1.125 -1.4,1 ; -1.4,1.375 -1.4,1.5 ; -1.4,1.625 -1.4,1.5 ; -1.05,-1.5 -1.4,-1.5 ; -1.05,-1 -1.4,-1 ; -1.05,-0.5 -1.4,-0.5 ; -1.05,0 -1.4,0 ; -1.05,0.5 -1.4,0.5 ; -1.05,1 -1.4,1 ; -1.05,1.5 -1.4,1.5 ; -0.5,-1.145 0,-1.145 ; -0.5,0 0,0 ; -0.5,0.778 0,0.778 ; 0,-1.645 0,-1.145 ; 0,-0.5 0,0 ; 0,0.5 0,0 ; 0,1.278 0,0.778 ; 0.5,-1.145 0,-1.145 ; 0.5,0 0,0 ; 0.5,0.778 0,0.778 ; 1.05,-1.5 1.4,-1.5 ; 1.05,-1 1.4,-1 ; 1.05,-0.5 1.4,-0.5 ; 1.05,0 1.4,0 ; 1.05,0.5 1.4,0.5 ; 1.05,1 1.4,1 ; 1.05,1.5 1.4,1.5 ; 1.4,-1.625 1.4,-1.5 ; 1.4,-1.375 1.4,-1.5 ; 1.4,-1.125 1.4,-1 ; 1.4,-0.875 1.4,-1 ; 1.4,-0.625 1.4,-0.5 ; 1.4,-0.375 1.4,-0.5 ; 1.4,-0.125 1.4,0 ; 1.4,0.125 1.4,0 ; 1.4,0.375 1.4,0.5 ; 1.4,0.625 1.4,0.5 ; 1.4,0.875 1.4,1 ; 1.4,1.125 1.4,1 ; 1.4,1.375 1.4,1.5 ; 1.4,1.625 1.4,1.5 ; 1.75,-1.5 1.4,-1.5 ; 1.75,-1 1.4,-1 ; 1.75,-0.5 1.4,-0.5 ; 1.75,0 1.4,0 ; 1.75,0.5 1.4,0.5 ; 1.75,1 1.4,1 ; 1.75,1.5 1.4,1.5
Mechanical 14:
  circle w0.1: c-0.9,1.35 r0.3
  lines w0.1: -1.55,-2.05 -1.55,2.05 1.55,2.05 1.55,-2.05 -1.55,-2.05
3D body "LINEAR_DE14MA.stp": height 0.8, standoff 0, extent -1.55,-2.05 1.55,2.05

## LINEAR_MS16(12) [mm] "SOP, 0.50mm Pitch; 16 Pins with 4 Pins Removed, 3.00mm W X 4.039mm L X 1.10mm H Body, IPC Medium Density"
height 1.1
pads (12):
  rect 1.4x0.3 smd: 1(-2.2,1.75) 3(-2.2,0.75) 5(-2.2,-0.25) 6(-2.2,-0.75) 7(-2.2,-1.25) 8(-2.2,-1.75) 9(2.2,-1.75) 10(2.2,-1.25) 11(2.2,-0.75) 12(2.2,-0.25) 14(2.2,0.75) 16(2.2,1.75)
Top Overlay:
  circle w0.25: c-2.65,2.4 r0.125
  lines w0.2: -1.175,1 -0.175,2 ; -1.175,1.2 -0.375,2 ; -1.175,1.4 -0.575,2 ; -1.175,1.6 -0.775,2 ; -1.175,1.8 -0.975,2 ; -1.175,-2 -1.175,2 1.175,2 1.175,-2 -1.175,-2
Mechanical 14:
  lines w0.1: -1.5,1.019 -0.5,2.019 ; -1.5,1.12 -0.6,2.019 ; -1.5,1.219 -0.7,2.019 ; -1.5,1.32 -0.8,2.019 ; -1.5,1.419 -0.9,2.019 ; -1.5,1.519 -1,2.019 ; -1.5,1.62 -1.1,2.019 ; -1.5,1.719 -1.2,2.019 ; -1.5,1.82 -1.3,2.019 ; -1.5,1.919 -1.4,2.019 ; -1.5,-2.019 -1.5,2.019 1.5,2.019 1.5,-2.019 -1.5,-2.019
Mechanical 15:
  circle w0.05: c0,0 r0.35
  lines w0.05: -0.5,0 0.5,0 ; 0,-0.5 0,0.5 ; -3.15,-2.35 -3.15,2.35 3.15,2.35 3.15,-2.35 -3.15,-2.35
3D body "LINEAR_MS16(12).stp": height 1.1, standoff 0, extent -2.466,-2.07 2.466,2.07

## LINEAR_UHE28MA [mm] "36-Lead Plastic QFN (5mm Ч 6mm), LINEAR UHE Package Variation: UHE28MA"
height 0.8
pads (30):
  rect 0.7x0.25 smd: 1(-2.4,2.25) 2(-2.4,1.75) 3(-2.4,1.25) 4(-2.4,0.75) 6(-2.4,-0.25) 8(-2.4,-1.25) 9(-2.4,-1.75) 10(-2.4,-2.25) 20(2.4,-1.75) 21(2.4,-1.25) 23(2.4,-0.25) 24(2.4,0.25) 25(2.4,0.75) 27(2.4,1.75) 28(2.4,2.25)
  rect 0.25x0.7 smd: 12(-1.25,-2.9) 13(-0.75,-2.9) 14(-0.25,-2.9) 15(0.25,-2.9) 16(0.75,-2.9) 17(1.25,-2.9) 30(1.25,2.9) 31(0.75,2.9) 32(0.25,2.9) 33(-0.25,2.9) 34(-0.75,2.9) 35(-1.25,2.9) 36(-1.75,2.9)
  rrect10% 3x1.88 smd: 37(0,1.06)
  rrect10% 3x1.53 smd: 38(0,-1.245)
Top Overlay:
  circle w0.25: c-3.275,2.525 r0.125
  lines w0.2: -2.55,-2.775 -2.55,-3.05 -1.775,-3.05 ; -2.55,2.775 -2.55,3.05 -2.275,3.05 ; 1.775,-3.05 2.55,-3.05 2.55,-2.275 ; 1.775,3.05 2.55,3.05 2.55,2.775
Mechanical 8:
  drawing of 284 lines, arcs and shapes, not listed
Mechanical 14:
  circle w0.1: c-1.5,2 r0.5
  lines w0.1: -2.55,-3.05 2.55,-3.05 2.55,3.05 -2.55,3.05 -2.55,-3.05
Mechanical 15:
  lines w0.05: -2.8,-3.3 -2.8,3.3 2.8,3.3 2.8,-3.3 -2.8,-3.3
3D body "LINEAR_UHE28MA.stp": height 0.8, standoff 0, extent -2.55,-3.05 2.55,3.05